# Altium footprint library Potentiometer.PcbLib: 55 footprints (part 3 of 4)
Each footprint in its own frame and in the unit in brackets; x right, y up, seen from the top. Pads: shape width x height; smd on the part's side, far side on the other; paste and mask are expansions set on the pad; w line width, h text height; cw(c..) or ccw(c..) is an arc to the next point about the centre after c.
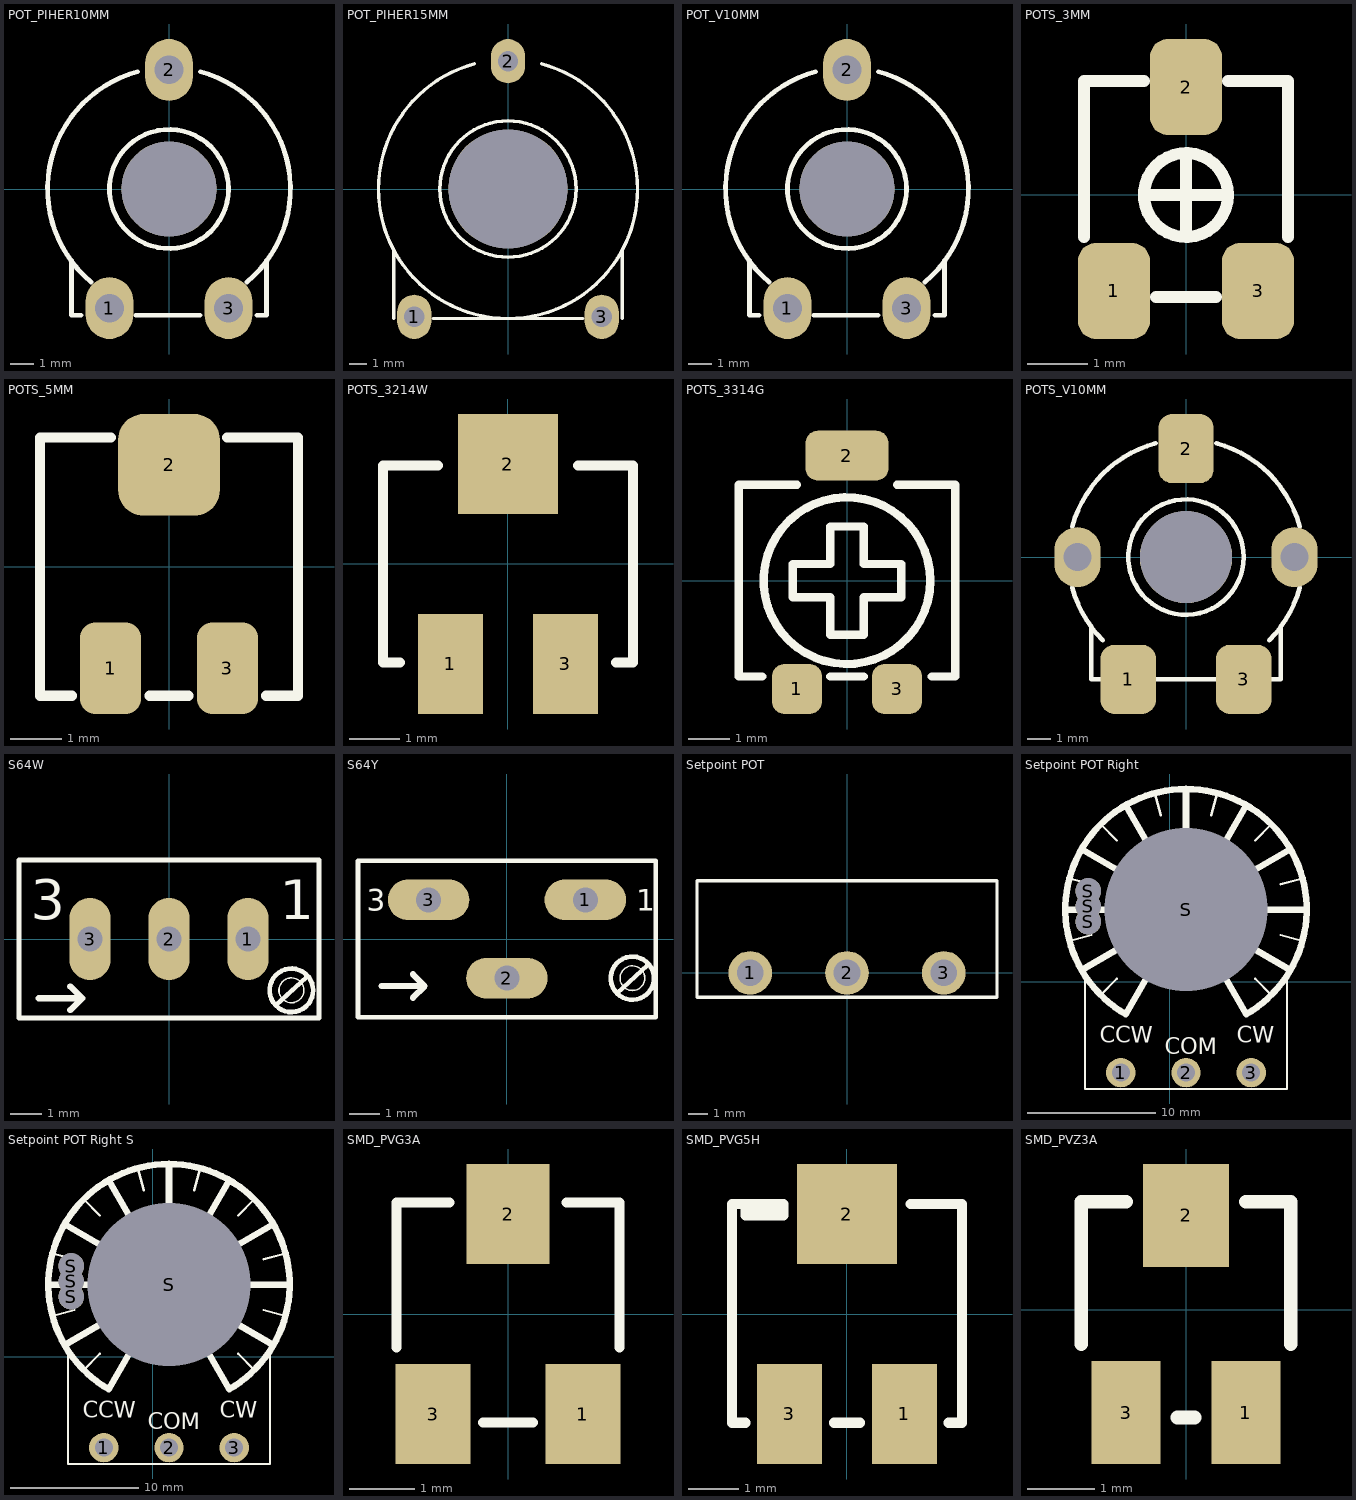
[diagram p2: the footprints below, top view; thin cyan lines are the x and y axes]

## POT_PIHER10MM [mm] "POT, TRIM, PIHER PT-10 10mm"
pads (4):
  oval 2x2.6 hole 1.2: 1(-2.5,-5) 2(0,5) 3(2.5,-5)
  round 4 hole 4 unplated mask+0.1: ""(0,0)
Top Overlay:
  circle w0.2: c0,0 r2.5
  lines w0.2: -4.1,-3 -4.1,-5.3 -3.7,-5.3 ; -3.278,-3.907 cw(c0,0) -1.32,4.926 ; -1.4,-5.3 1.3,-5.3 ; 1.32,4.926 cw(c0,0) 3.278,-3.907 ; 3.7,-5.3 4.1,-5.3 4.1,-3
3D body "User Library-PT10MV.step": height 6.26, standoff -3.5, extent -5.15,-5.069 5.15,5.531

## POT_PIHER15MM [mm] "POT, TRIM, PIHER PT-15 15mm"
pads (4):
  oval 2x2.6 hole 1.2: 1(-5.5,-7.5) 2(0,7.5) 3(5.5,-7.5)
  round 7 hole 7 unplated mask+0.1: ""(0,0)
Top Overlay:
  circle w0.2: c0,0 r4
  lines w0.2: -6.7,-7.6 -6.7,-3.6 ; -4.4,-7.6 4.4,-7.6 ; -1.967,7.341 ccw(c0,0) -7.6,0 ccw(c0,0) 7.6,0 ccw(c0,0) 1.967,7.341 ; 6.7,-7.6 6.7,-3.6
3D body "Trimmer_Piher_PT-15.step": height 6.97, standoff -3.93, extent -7.5,-7.7 7.5,7.696

## POT_V10MM [mm] "POT, TRIM, V-10 10mm"
pads (4):
  oval 2x2.6 hole 1.2: 1(-2.5,-5) 2(0,5) 3(2.5,-5)
  round 4 hole 4 unplated mask+0.1: ""(0,0)
Top Overlay:
  circle w0.2: c0,0 r2.5
  lines w0.2: -4.1,-3 -4.1,-5.3 -3.7,-5.3 ; -3.278,-3.907 cw(c0,0) -1.32,4.926 ; -1.4,-5.3 1.3,-5.3 ; 1.32,4.926 cw(c0,0) 3.278,-3.907 ; 3.7,-5.3 4.1,-5.3 4.1,-3
3D body "User Library-Trimpot V10.step": height 5.9, standoff -3.4, extent -5.15,-5.207 5.15,5.093

## POTS_3MM [mm] "POT SMD, 3.0X3.0mm, Trimming PVG3A PVZ3A"
pads (3):
  rrect50% 1.2x1.6 smd: 1(-1.2,-1.6) 2(0,1.8) 3(1.2,-1.6)
Top Overlay:
  circle w0.2: c0,0 r0.7
  lines w0.2: -1.7,-0.7 -1.7,1.9 -0.7,1.9 ; -0.7,0 0.7,0 ; -0.5,-1.7 0.5,-1.7 ; 0,-0.7 0,0.7 ; 0.7,1.9 1.7,1.9 1.7,-0.7
3D body "User Library-PVZ3A.STEP": height 1.95, standoff 0, extent -1.55,-1.85 1.55,1.84

## POTS_5MM [mm] "POT SMD, 5.0X5.0mm, Trimming PVG5H"
pads (3):
  rrect50% 1.2x1.8 smd: 1(-1.15,-2) 3(1.15,-2)
  rrect50% 2x2 smd: 2(0,2)
Top Overlay:
  lines w0.2: -1.905,-2.54 -2.54,-2.54 -2.54,2.54 -1.143,2.54 ; -0.381,-2.54 0.381,-2.54 ; 1.143,2.54 2.54,2.54 2.54,-2.54 1.905,-2.54
3D body "User Library-PVG5H.STEP": height 3.7, standoff 0, extent -2.4,-2.55 2.4,2.55

## POTS_3214W [mm] "POT SMD, 4.0X5.0mm, Trimming SM-42/43W 3214W"
pads (3):
  rect 1.3x2 smd: 1(-1.15,-2) 3(1.15,-2)
  rect 2x2 smd: 2(0,2)
Top Overlay:
  lines w0.2: -2.159,-1.97 -2.5,-1.97 -2.5,1.97 -1.397,1.97 ; 1.397,1.97 2.5,1.97 2.5,-1.97 2.159,-1.97
3D body "SW3dPS-Pot 3214.STEP": height 5.4, standoff 0, extent -2.4,-1.97 2.4,1.97

## POTS_3314G [mm] "POT SMD, 5.0X5.0mm, Trimming, 3314G"
pads (3):
  rrect50% 1.2x1.2 smd: 1(-1.2,-2.6) 3(1.2,-2.6)
  rrect50% 2x1.2 smd: 2(0,3)
Top Overlay:
  circle w0.2: c0,0 r2
  lines w0.2: -1.3,-0.4 -0.4,-0.4 -0.4,-1.3 0.4,-1.3 0.4,-0.4 1.3,-0.4 1.3,0.4 0.4,0.4 0.4,1.3 -0.4,1.3 -0.4,0.4 -1.3,0.4 -1.3,-0.4
  lines w0.203: -2.032,-2.3 -2.6,-2.3 -2.6,2.3 -1.2,2.3 ; -0.4,-2.3 0.4,-2.3 ; 1.2,2.3 2.6,2.3 2.6,-2.3 2.032,-2.3
3D body "3314g-1-104e.stp": height 2.67, standoff -0.06, extent -2.452,-2.925 2.548,3.272

## POTS_V10MM [mm] "POT, TRIM, V-10 10mm SMD"
pads (6):
  rrect50% 2.4x3 smd: 1(-2.5,-5.3) 2(0,4.7) 3(2.5,-5.3)
  oval 2x2.6 hole 1.2: ""(-4.7,0) ""(4.7,0)
  round 4 hole 4 unplated mask+0.1: ""(0,0)
Top Overlay:
  circle w0.2: c0,0 r2.5
  lines w0.2: -4.926,-1.32 ccw(c0,0) -3.606,-3.606 ; -4.926,1.32 cw(c0,0) -1.32,4.926 ; -4.1,-3 -4.1,-5.3 -3.7,-5.3 ; -1.4,-5.3 1.3,-5.3 ; 1.32,4.926 cw(c0,0) 4.926,1.32 ; 3.606,-3.606 ccw(c0,0) 4.926,-1.32 ; 3.7,-5.3 4.1,-5.3 4.1,-3
3D body "User Library-Trimpot V60.step": height 5.7, standoff -0.85, extent -5.15,-5.742 5.15,5.15

## S64W [mil]
pads (3):
  oval 52x104 hole 32: 1(100,0) 2(0,0) 3(-100,0)
Top Overlay:
  circle w6: c155,-65 r27.56
  circle w2: c155,-65 r15.75
  lines w5.98: 135.32,-84.08 174.2,-48.27
  lines w6: -190,-100 190,-100 190,100 -190,100 -190,-100
  lines w7.87: -165,-75 -110.05,-75 ; -125,-90 -110,-75 -125,-60
  text "3" at -175,25 h50
  text "1" at 140,25 h50
3D body "SW3dPS-bourns 3296W pot.STEP": height 454.72, standoff -251.97, extent -187.2,-96 188,94.2

## S64Y [mil]
pads (3):
  oval 104x52 hole 32: 1(100,50) 2(0,-50) 3(-100,50)
Top Overlay:
  circle w6: c160,-50 r27.56
  circle w2: c160,-50 r15.75
  lines w5.98: 140.32,-69.08 179.2,-33.27
  lines w6: -190,-100 190,-100 190,100 -190,100 -190,-100
  lines w7.87: -160,-60 -105.05,-60 ; -120,-75 -105,-60 -120,-45
  text "3" at -178.91,36.14 h27.56
  text "1" at 165.14,36.14 h27.56
3D body "SW3dPS-bourns 3296Y pot.STEP": height 454.72, standoff -251.97, extent -187.6,-95 187.6,95.2

## Setpoint POT [mil]
pads (3):
  round 90 hole 55: 1(-200,0) 2(0,0) 3(200,0)
Top Overlay:
  lines w7: -310,-50 310,-50 310,190 -310,190 -310,-50
3D body "volome cover2.STEP": height 847.48, standoff 173.86, extent -298.62,-943.34 298.63,-155.94
3D body "POT.STEP": height 157.48, standoff -812.52, extent -310,-816.22 310,190

## Setpoint POT Right [mil]
pads (7):
  round 90 hole 55: 1(-150,-278.5) 2(50,-278.5) 3(250,-278.5)
  round 78.74 hole 78.74: S(-250,184.5) S(-250,231.5) S(-250,278.5)
  round 492.13 hole 500: S(50,221.5)
Top Overlay:
  lines w7: -307.39,125.74 -239.78,143.85 ; -307.39,317.26 -239.78,299.15 ; -260,21.5 -260,-328.5 360,-328.5 360,21.5 ; -211.63,-40.13 -162.13,9.37 ; -211.63,483.13 -162.13,433.63 ; -45.76,578.89 -27.65,511.28 ; 127.65,511.28 145.76,578.89 ; 262.13,9.37 311.63,-40.13 ; 262.13,433.63 311.63,483.13 ; 339.78,143.85 407.39,125.74 ; 339.78,299.15 407.39,317.26
  lines w20: -320,221.5 -200,221.5 ; -270.43,36.5 -166.51,96.5 ; -270.43,406.5 -166.51,346.5 ; -135,541.93 -75,438.01 ; -75,4.99 -135,-98.93 cw(c50,221.5) 235,-98.93 175,4.99 ; 50,471.5 50,591.5 ; 175,438.01 235,541.93 ; 266.51,96.5 370.43,36.5 ; 266.51,346.5 370.43,406.5 ; 300,221.5 420,221.5
  text "CCW" at -214,-186.5 h50
  text "CW" at 205,-186.5 h50
  text "COM" at -15,-221.5 h50
3D body "POT.STEP": height -85.59, standoff -1091.81, extent -260,-439.5 360,530.5

## Setpoint POT Right S [mil]
pads (7):
  round 90 hole 55: 1(-150,-278.5) 2(50,-278.5) 3(250,-278.5)
  round 78.74 hole 78.74: S(-250,184.5) S(-250,231.5) S(-250,278.5)
  round 492.13 hole 500: S(50,221.5)
Top Overlay:
  lines w7: -307.39,125.74 -239.78,143.85 ; -307.39,317.26 -239.78,299.15 ; -260,21.5 -260,-328.5 360,-328.5 360,21.5 ; -211.63,-40.13 -162.13,9.37 ; -211.63,483.13 -162.13,433.63 ; -45.76,578.89 -27.65,511.28 ; 127.65,511.28 145.76,578.89 ; 262.13,9.37 311.63,-40.13 ; 262.13,433.63 311.63,483.13 ; 339.78,143.85 407.39,125.74 ; 339.78,299.15 407.39,317.26
  lines w20: -320,221.5 -200,221.5 ; -270.43,36.5 -166.51,96.5 ; -270.43,406.5 -166.51,346.5 ; -135,541.93 -75,438.01 ; -75,4.99 -135,-98.93 cw(c50,221.5) 235,-98.93 175,4.99 ; 50,471.5 50,591.5 ; 175,438.01 235,541.93 ; 266.51,96.5 370.43,36.5 ; 266.51,346.5 370.43,406.5 ; 300,221.5 420,221.5
  text "COM" at -15,-221.5 h50
  text "CW" at 205,-186.5 h50
  text "CCW" at -214,-186.5 h50
3D body "volome cover2.STEP": height 1240.16, standoff 452.76, extent -248.4,-85.91 348.84,587.71
3D body "POT.STEP": height -85.59, standoff -1091.81, extent -260,-439.5 360,530.5

## SMD_PVG3A [mil]
pads (3):
  rect 45x60 smd: 1(45,-60) 3(-45,-60)
  rect 50x60 smd: 2(0,60)
Top Overlay:
  lines w6: -67,-20 -67,67 -35,67 ; -15,-65 15,-65 ; 35,67 67,67 67,-20
3D body "SW3dPS-TRIMMER_PVG3A.STEP": height 78.74, standoff 0, extent -66.93,-70 66.93,71.73

## SMD_PVG5H [mm]
pads (3):
  rect 1.3x2 smd: 1(1.15,-2) 3(-1.15,-2)
  rect 2x2 smd: 2(0,2)
Top Overlay:
  rectangle: -2.032,1.975 -1.27,2.3
  lines w0.203: -2.032,-2.175 -2.3,-2.175 -2.3,2.2 -1.27,2.2 -1.27,1.975 -2.032,1.975 -2.032,2.2 ; -0.254,-2.175 0.254,-2.175 ; 1.27,2.2 2.3,2.2 2.3,-2.175 2.032,-2.175
3D body "User Library-PVG5H.STEP": height 3.7, standoff 0, extent -2.4,-2.55 2.4,2.55

## SMD_PVZ3A [mil]
pads (3):
  rect 40x60 smd: 1(35,-60) 3(-35,-60)
  rect 50x60 smd: 2(0,55)
Top Overlay:
  lines w8: -61.02,-20 -61.02,63 -35,63 ; -5,-62.84 5,-62.84 ; 35,63 61.02,63 61.02,-20
3D body "User Library-PVZ3A.STEP": height 76.77, standoff 0, extent -61.02,-72.83 61.02,72.44